# Altium footprint library Capacitance.PcbLib: 176 footprints (part 2 of 11)
Each footprint in its own frame and in the unit in brackets; x right, y up, seen from the top. Pads: shape width x height; smd on the part's side, far side on the other; paste and mask are expansions set on the pad; w line width, h text height; cw(c..) or ccw(c..) is an arc to the next point about the centre after c.
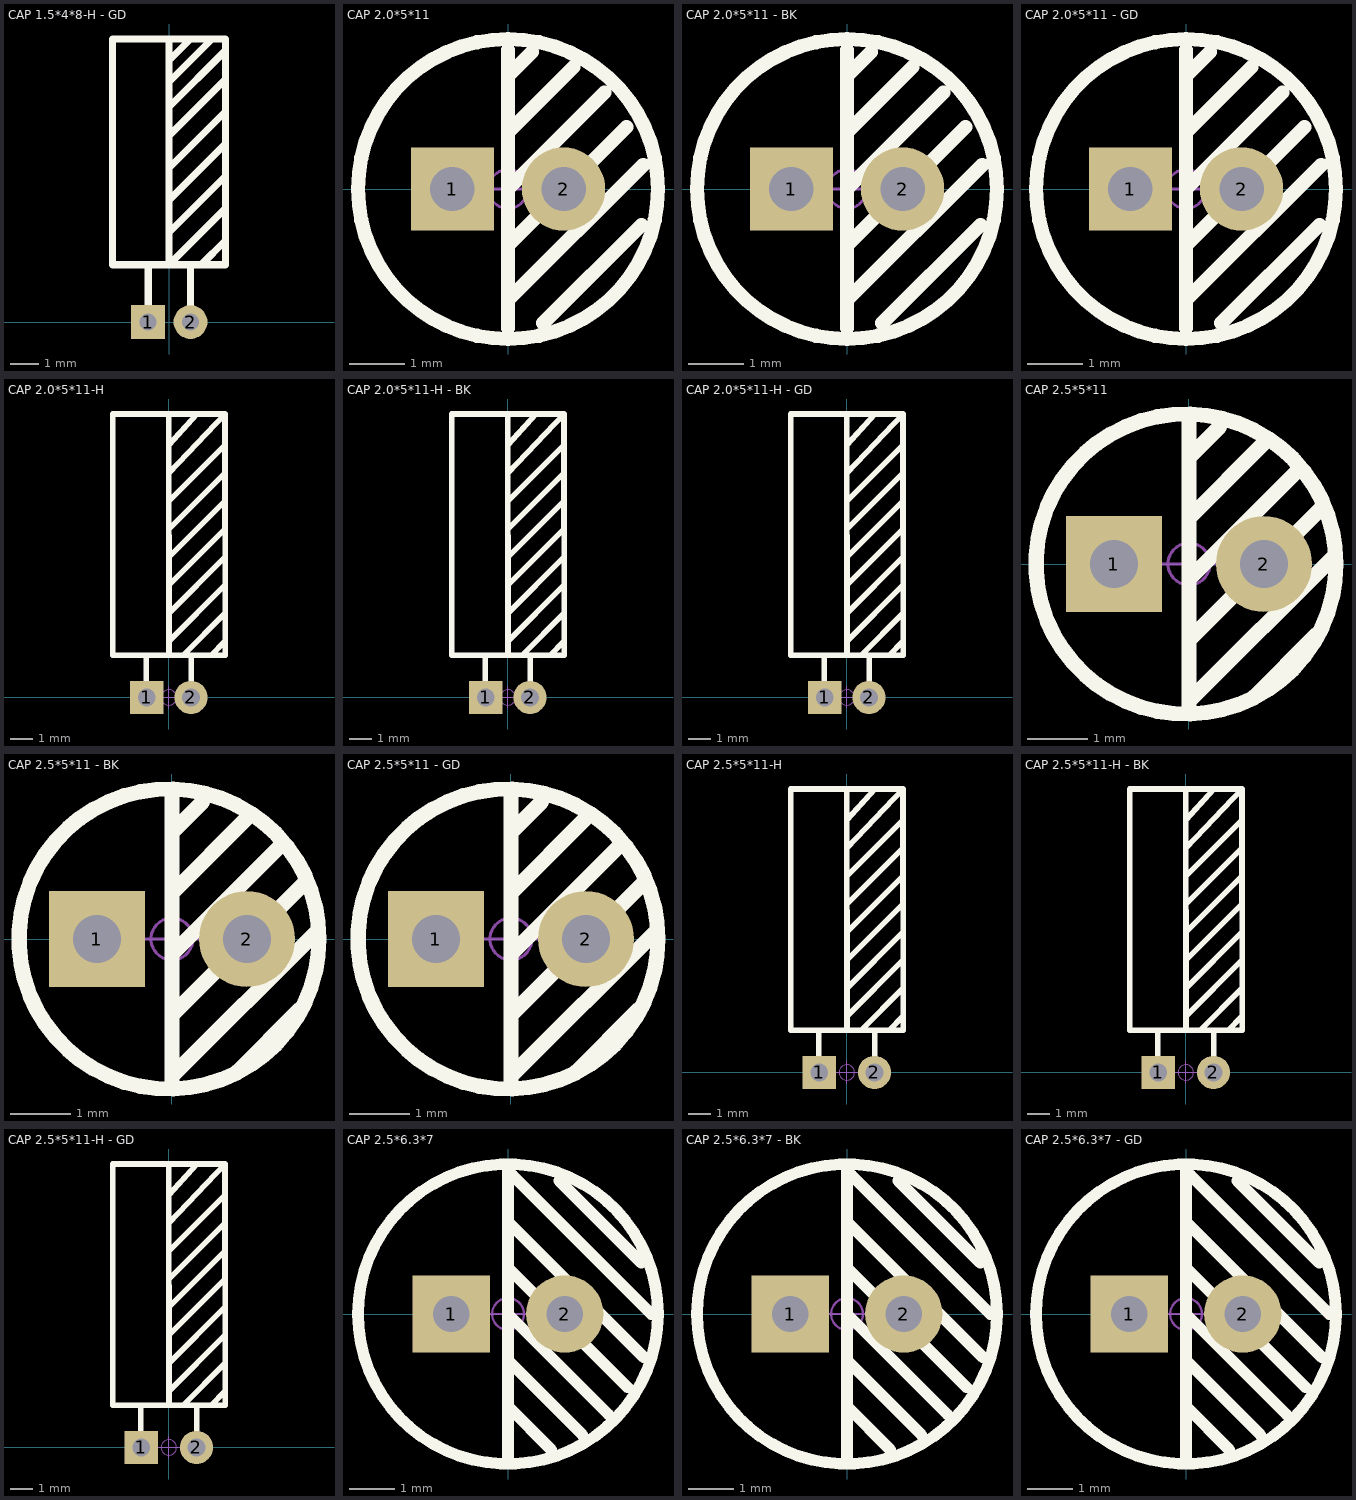
[diagram p1: the footprints below, top view; thin cyan lines are the x and y axes]

## CAP 1.5*4*8-H - GD [mm] "ï¿½Å¾ï¿½1.5mmÖ±ï¿½ï¿½4mmï¿½ß¶ï¿½8mm"
pads (2):
  rect 1.2x1.2 hole 0.6: 1(-0.75,0)
  round 1.2 hole 0.6: 2(0.75,0)
Top Overlay:
  lines w0.254: -0.75,0 -0.75,2 ; -0.012,3.175 1.988,5.175 1.988,5.207 ; -0.012,4.318 1.988,6.318 1.988,6.35 ; -0.012,5.461 1.988,7.461 1.988,7.493 ; -0.012,6.604 1.988,8.604 1.988,8.636 ; -0.012,7.62 1.965,9.597 ccw(c1.911,9.652) 1.988,9.652 ; -0.012,8.509 1.51,10.031 cw(c1.512,10.03) 1.512,10.032 ; -0.012,9.271 0.748,10.031 cw(c0.75,10.03) 0.75,10.032 ; -0.012,10.032 -0.012,2.032 ; 0.75,0 0.75,2 ; 0.877,2.921 -0.012,2.032 ; 1.131,2.032 1.988,2.889 1.988,2.921 ; 1.988,4.064 1.988,4.032 -0.012,2.032 ; -2.012,2.032 1.988,2.032 1.988,10.032 -2.012,10.032 -2.012,2.032
3D body "CAP 1.5X4X8-H.STEP": height 4.02, standoff -3.48, extent -2,-0.25 2.02,10

## CAP 2.0*5*11 [mm] "ï¿½Å¾ï¿½2mmÖ±ï¿½ï¿½5mmï¿½ß¶ï¿½11mm"
pads (2):
  rect 1.5x1.5 hole 0.8: 1(-1,0)
  round 1.5 hole 0.8: 2(1,0)
Top Overlay:
  circle w0.254: c0,0 r2.7
  lines w0.254: 0,-2.5 0,-2 ; 0,-1.016 2.134,1.118 ; 0,0 1.74,1.74 ; 0,1.016 1.181,2.197 ; 0,2.032 0.432,2.464 ; 0,2.5 0,-2 ; 0.635,-2.413 2.4,-0.648 ; 2.435,0.435 0,-2
Mechanical 15:
  circle w0.05: c0,0 r0.35
  lines w0.05: -0.5,0 0.5,0 ; 0,-0.5 0,0.5
3D body "CAP 2X5X11.STEP": height 11.04, standoff -3.42, extent -2.5,-2.499 2.51,2.499

## CAP 2.0*5*11 - BK [mm] "ï¿½Å¾ï¿½2mmÖ±ï¿½ï¿½5mmï¿½ß¶ï¿½11mm"
pads (2):
  rect 1.5x1.5 hole 0.8: 1(-1,0)
  round 1.5 hole 0.8: 2(1,0)
Top Overlay:
  circle w0.254: c0,0 r2.7
  lines w0.254: 0,-2.5 0,-2 ; 0,-1.016 2.134,1.118 ; 0,0 1.74,1.74 ; 0,1.016 1.181,2.197 ; 0,2.032 0.432,2.464 ; 0,2.5 0,-2 ; 0.635,-2.413 2.4,-0.648 ; 2.435,0.435 0,-2
Mechanical 15:
  circle w0.05: c0,0 r0.35
  lines w0.05: -0.5,0 0.5,0 ; 0,-0.5 0,0.5
3D body "CAP 2X5X11.STEP": height 11.04, standoff -3.42, extent -2.5,-2.499 2.51,2.499

## CAP 2.0*5*11 - GD [mm] "ï¿½Å¾ï¿½2mmÖ±ï¿½ï¿½5mmï¿½ß¶ï¿½11mm"
pads (2):
  rect 1.5x1.5 hole 0.8: 1(-1,0)
  round 1.5 hole 0.8: 2(1,0)
Top Overlay:
  circle w0.254: c0,0 r2.7
  lines w0.254: 0,-2.5 0,-2 ; 0,-1.016 2.134,1.118 ; 0,0 1.74,1.74 ; 0,1.016 1.181,2.197 ; 0,2.032 0.432,2.464 ; 0,2.5 0,-2 ; 0.635,-2.413 2.4,-0.648 ; 2.435,0.435 0,-2
Mechanical 15:
  circle w0.05: c0,0 r0.35
  lines w0.05: -0.5,0 0.5,0 ; 0,-0.5 0,0.5
3D body "CAP 2X5X11.STEP": height 11.04, standoff -3.42, extent -2.5,-2.499 2.51,2.499

## CAP 2.0*5*11-H [mm] "ï¿½Å¾ï¿½2mmÖ±ï¿½ï¿½5mmï¿½ß¶ï¿½11mm"
pads (2):
  rect 1.5x1.5 hole 0.8: 1(-1,0)
  round 1.5 hole 0.8: 2(1,0)
Top Overlay:
  lines w0.254: -1.016,0.762 -1.016,1.905 ; 0,2.54 2.548,5.08 ; 0,6.35 2.54,8.89 ; 0.001,11.43 1.27,12.827 ; 0,12.827 0.006,1.905 ; 0.001,10.16 2.54,12.827 ; 0.003,7.62 2.543,10.16 ; 0.002,8.89 2.541,11.43 ; 0.004,5.08 2.545,7.62 ; 0.005,3.81 2.547,6.35 ; 0.635,1.905 2.54,3.81 ; 1.016,0.762 1.016,1.905 ; 1.905,1.905 2.54,2.54 ; 2.54,12.827 -2.54,12.827 -2.54,1.905 2.552,1.905 2.54,12.827
Mechanical 15:
  circle w0.05: c0,0 r0.35
  lines w0.05: -0.5,0 0.5,0 ; 0,-0.5 0,0.5
3D body "CAP 2X5X11-H.STEP": height 5.02, standoff -3.48, extent -2.5,-0.25 2.51,12.96

## CAP 2.0*5*11-H - BK [mm] "ï¿½Å¾ï¿½2mmÖ±ï¿½ï¿½5mmï¿½ß¶ï¿½11mm"
pads (2):
  rect 1.5x1.5 hole 0.8: 1(-1,0)
  round 1.5 hole 0.8: 2(1,0)
Top Overlay:
  lines w0.254: -1.016,0.762 -1.016,1.905 ; 0,2.54 2.548,5.08 ; 0,6.35 2.54,8.89 ; 0.001,11.43 1.27,12.827 ; 0,12.827 0.006,1.905 ; 0.001,10.16 2.54,12.827 ; 0.003,7.62 2.543,10.16 ; 0.002,8.89 2.541,11.43 ; 0.004,5.08 2.545,7.62 ; 0.005,3.81 2.547,6.35 ; 0.635,1.905 2.54,3.81 ; 1.016,0.762 1.016,1.905 ; 1.905,1.905 2.54,2.54 ; 2.54,12.827 2.552,1.905 -2.54,1.905 -2.54,12.827 2.54,12.827
Mechanical 15:
  circle w0.05: c0,0 r0.35
  lines w0.05: -0.5,0 0.5,0 ; 0,-0.5 0,0.5
3D body "CAP 2X5X11-H.STEP": height 5.02, standoff -3.48, extent -2.5,-0.25 2.51,12.96

## CAP 2.0*5*11-H - GD [mm] "ï¿½Å¾ï¿½2mmÖ±ï¿½ï¿½5mmï¿½ß¶ï¿½11mm"
pads (2):
  rect 1.5x1.5 hole 0.8: 1(-1,0)
  round 1.5 hole 0.8: 2(1,0)
Top Overlay:
  lines w0.254: -1.016,0.762 -1.016,1.905 ; 0,2.54 2.548,5.08 ; 0,6.35 2.54,8.89 ; 0.001,11.43 1.27,12.827 ; 0,12.827 0.006,1.905 ; 0.001,10.16 2.54,12.827 ; 0.003,7.62 2.543,10.16 ; 0.002,8.89 2.541,11.43 ; 0.004,5.08 2.545,7.62 ; 0.005,3.81 2.547,6.35 ; 0.635,1.905 2.54,3.81 ; 1.016,0.762 1.016,1.905 ; 1.905,1.905 2.54,2.54 ; 2.54,12.827 2.552,1.905 -2.54,1.905 -2.54,12.827 2.54,12.827
Mechanical 15:
  circle w0.05: c0,0 r0.35
  lines w0.05: -0.5,0 0.5,0 ; 0,-0.5 0,0.5
3D body "CAP 2X5X11-H.STEP": height 5.02, standoff -3.48, extent -2.5,-0.25 2.51,12.96

## CAP 2.5*5*11 [mm] "ï¿½Å¾ï¿½2.5mmÖ±ï¿½ï¿½5mmï¿½ß¶ï¿½11mm"
pads (2):
  rect 1.6x1.6 hole 0.8: 1(-1.25,0)
  round 1.6 hole 0.8: 2(1.25,0)
Top Overlay:
  circle w0.254: c-0.05,0 r2.5
  lines w0.254: 0,-2.489 0,2.413 ; 0,-2.286 2.438,0.152 ; 0,-1.27 2.222,0.953 ; 0,-0.254 1.841,1.587 ; 0,0.762 1.27,2.032 ; 0,1.778 0.508,2.286 ; 1.079,-2.222 2.134,-1.168
Mechanical 15:
  circle w0.05: c0,0 r0.35
  lines w0.05: -0.5,0 0.5,0 ; 0,-0.5 0,0.5
3D body "CAP 2.5X5X11.STEP": height 11.03, standoff -3.43, extent -2.5,-2.499 2.51,2.499

## CAP 2.5*5*11 - BK [mm] "ï¿½Å¾ï¿½2.5mmÖ±ï¿½ï¿½5mmï¿½ß¶ï¿½11mm"
pads (2):
  rect 1.6x1.6 hole 0.8: 1(-1.25,0)
  round 1.6 hole 0.8: 2(1.25,0)
Top Overlay:
  circle w0.254: c-0.05,0 r2.5
  lines w0.254: 0,-2.489 0,2.413 ; 0,-2.286 2.438,0.152 ; 0,-1.27 2.222,0.953 ; 0,-0.254 1.841,1.587 ; 0,0.762 1.27,2.032 ; 0,1.778 0.508,2.286 ; 1.079,-2.222 2.134,-1.168
Mechanical 15:
  circle w0.05: c0,0 r0.35
  lines w0.05: -0.5,0 0.5,0 ; 0,-0.5 0,0.5
3D body "CAP 2.5X5X11.STEP": height 11.04, standoff -3.42, extent -2.5,-2.499 2.51,2.499

## CAP 2.5*5*11 - GD [mm] "ï¿½Å¾ï¿½2.5mmÖ±ï¿½ï¿½5mmï¿½ß¶ï¿½11mm"
pads (2):
  rect 1.6x1.6 hole 0.8: 1(-1.25,0)
  round 1.6 hole 0.8: 2(1.25,0)
Top Overlay:
  circle w0.254: c-0.05,0 r2.5
  lines w0.254: 0,-2.489 0,2.413 ; 0,-2.286 2.438,0.152 ; 0,-1.27 2.222,0.953 ; 0,-0.254 1.841,1.587 ; 0,0.762 1.27,2.032 ; 0,1.778 0.508,2.286 ; 1.079,-2.222 2.134,-1.168
Mechanical 15:
  circle w0.05: c0,0 r0.35
  lines w0.05: -0.5,0 0.5,0 ; 0,-0.5 0,0.5
3D body "CAP 2.5X5X11.STEP": height 11.04, standoff -3.42, extent -2.5,-2.537 2.51,2.461

## CAP 2.5*5*11-H [mm] "ï¿½Å¾ï¿½2.5mmÖ±ï¿½ï¿½5mmï¿½ß¶ï¿½11mm"
pads (2):
  rect 1.5x1.5 hole 0.8: 1(-1.25,0)
  round 1.5 hole 0.8: 2(1.25,0)
Top Overlay:
  lines w0.254: -1.266,0.762 -1.266,1.905 ; 0,2.54 2.548,5.08 ; 0,6.35 2.54,8.89 ; 0.001,11.43 1.27,12.827 ; 0,12.827 0.006,1.905 ; 0.001,10.16 2.54,12.827 ; 0.003,7.62 2.543,10.16 ; 0.002,8.89 2.541,11.43 ; 0.004,5.08 2.545,7.62 ; 0.005,3.81 2.547,6.35 ; 0.635,1.905 2.54,3.81 ; 1.266,0.762 1.266,1.905 ; 1.905,1.905 2.54,2.54 ; 2.54,12.827 -2.54,12.827 -2.54,1.905 2.552,1.905 2.54,12.827
Mechanical 15:
  circle w0.05: c0,0 r0.35
  lines w0.05: -0.5,0 0.5,0 ; 0,-0.5 0,0.5
3D body "CAP 2.5X5X11-H.STEP": height 5.02, standoff -3.48, extent -2.5,-0.25 2.51,12.96

## CAP 2.5*5*11-H - BK [mm] "ï¿½Å¾ï¿½2.5mmÖ±ï¿½ï¿½5mmï¿½ß¶ï¿½11mm"
pads (2):
  rect 1.5x1.5 hole 0.8: 1(-1.25,0)
  round 1.5 hole 0.8: 2(1.25,0)
Top Overlay:
  lines w0.254: -1.266,0.762 -1.266,1.905 ; 0,2.54 2.548,5.08 ; 0,6.35 2.54,8.89 ; 0.001,11.43 1.27,12.827 ; 0,12.827 0.006,1.905 ; 0.001,10.16 2.54,12.827 ; 0.003,7.62 2.543,10.16 ; 0.002,8.89 2.541,11.43 ; 0.004,5.08 2.545,7.62 ; 0.005,3.81 2.547,6.35 ; 0.635,1.905 2.54,3.81 ; 1.266,0.762 1.266,1.905 ; 1.905,1.905 2.54,2.54 ; 2.54,12.827 2.552,1.905 -2.54,1.905 -2.54,12.827 2.54,12.827
Mechanical 15:
  circle w0.05: c0,0 r0.35
  lines w0.05: -0.5,0 0.5,0 ; 0,-0.5 0,0.5
3D body "CAP 2.5X5X11-H.STEP": height 5.02, standoff -3.48, extent -2.5,-0.25 2.51,12.96

## CAP 2.5*5*11-H - GD [mm] "ï¿½Å¾ï¿½2.5mmÖ±ï¿½ï¿½5mmï¿½ß¶ï¿½11mm"
pads (2):
  rect 1.5x1.5 hole 0.8: 1(-1.25,0)
  round 1.5 hole 0.8: 2(1.25,0)
Top Overlay:
  lines w0.254: -1.266,0.762 -1.266,1.905 ; 0,2.54 2.548,5.08 ; 0,6.35 2.54,8.89 ; 0.001,11.43 1.27,12.827 ; 0,12.827 0.006,1.905 ; 0.001,10.16 2.54,12.827 ; 0.003,7.62 2.543,10.16 ; 0.002,8.89 2.541,11.43 ; 0.004,5.08 2.545,7.62 ; 0.005,3.81 2.547,6.35 ; 0.635,1.905 2.54,3.81 ; 1.266,0.762 1.266,1.905 ; 1.905,1.905 2.54,2.54 ; 2.54,12.827 -2.54,12.827 -2.54,1.905 2.552,1.905 2.54,12.827
Mechanical 15:
  circle w0.05: c0,0 r0.35
  lines w0.05: -0.5,0 0.5,0 ; 0,-0.5 0,0.5
3D body "CAP 2.5X5X11-H.STEP": height 5.02, standoff -3.48, extent -2.5,-0.25 2.51,12.96

## CAP 2.5*6.3*7 [mm] "ï¿½Å¾ï¿½2.5mmÖ±ï¿½ï¿½6.3mmï¿½ß¶ï¿½7mm"
pads (2):
  rect 1.7x1.7 hole 0.8: 1(-1.25,0)
  round 1.7 hole 0.8: 2(1.25,0)
Top Overlay:
  circle w0.254: c0,0 r3.3
  lines w0.254: 0,-3.15 0,3.15 ; 0,-2.032 0.953,-2.984 ; 0,-1.016 1.638,-2.654 ; 0,0 2.21,-2.21 ; 0,1.016 2.629,-1.613 ; 0,2.032 2.984,-0.953 ; 0,3.048 0.102,3.048 3.15,0 ; 1.13,2.934 2.934,1.13
Mechanical 15:
  circle w0.05: c0,0 r0.35
  lines w0.05: -0.5,0 0.5,0 ; 0,-0.5 0,0.5
3D body "CAP 2.5X6.3X7.STEP": height 7.03, standoff -3.38, extent -3.15,-3.15 3.16,3.15

## CAP 2.5*6.3*7 - BK [mm] "ï¿½Å¾ï¿½2.5mmÖ±ï¿½ï¿½6.3mmï¿½ß¶ï¿½7mm"
pads (2):
  rect 1.7x1.7 hole 0.8: 1(-1.25,0)
  round 1.7 hole 0.8: 2(1.25,0)
Top Overlay:
  circle w0.254: c0,0 r3.3
  lines w0.254: 0,-3.15 0,3.15 ; 0,-2.032 0.953,-2.984 ; 0,-1.016 1.638,-2.654 ; 0,0 2.21,-2.21 ; 0,1.016 2.629,-1.613 ; 0,2.032 2.984,-0.953 ; 0,3.048 0.102,3.048 3.15,0 ; 1.13,2.934 2.934,1.13
Mechanical 15:
  circle w0.05: c0,0 r0.35
  lines w0.05: -0.5,0 0.5,0 ; 0,-0.5 0,0.5
3D body "CAP 2.5X6.3X7.STEP": height 7.04, standoff -3.37, extent -3.15,-3.15 3.16,3.15

## CAP 2.5*6.3*7 - GD [mm] "ï¿½Å¾ï¿½2.5mmÖ±ï¿½ï¿½6.3mmï¿½ß¶ï¿½7mm"
pads (2):
  rect 1.7x1.7 hole 0.8: 1(-1.25,0)
  round 1.7 hole 0.8: 2(1.25,0)
Top Overlay:
  circle w0.254: c0,0 r3.3
  lines w0.254: 0,-3.15 0,3.15 ; 0,-2.032 0.953,-2.984 ; 0,-1.016 1.638,-2.654 ; 0,0 2.21,-2.21 ; 0,1.016 2.629,-1.613 ; 0,2.032 2.984,-0.953 ; 0,3.048 0.102,3.048 3.15,0 ; 1.13,2.934 2.934,1.13
Mechanical 15:
  circle w0.05: c0,0 r0.35
  lines w0.05: -0.5,0 0.5,0 ; 0,-0.5 0,0.5
3D body "CAP 2.5X6.3X7.STEP": height 7.04, standoff -3.37, extent -3.15,-3.15 3.16,3.15